# Altium footprint library THU.PcbLib: 477 footprints (part 1 of 30)
Each footprint in its own frame and in the unit in brackets; x right, y up, seen from the top. Pads: shape width x height; smd on the part's side, far side on the other; paste and mask are expansions set on the pad; w line width, h text height; cw(c..) or ccw(c..) is an arc to the next point about the centre after c.
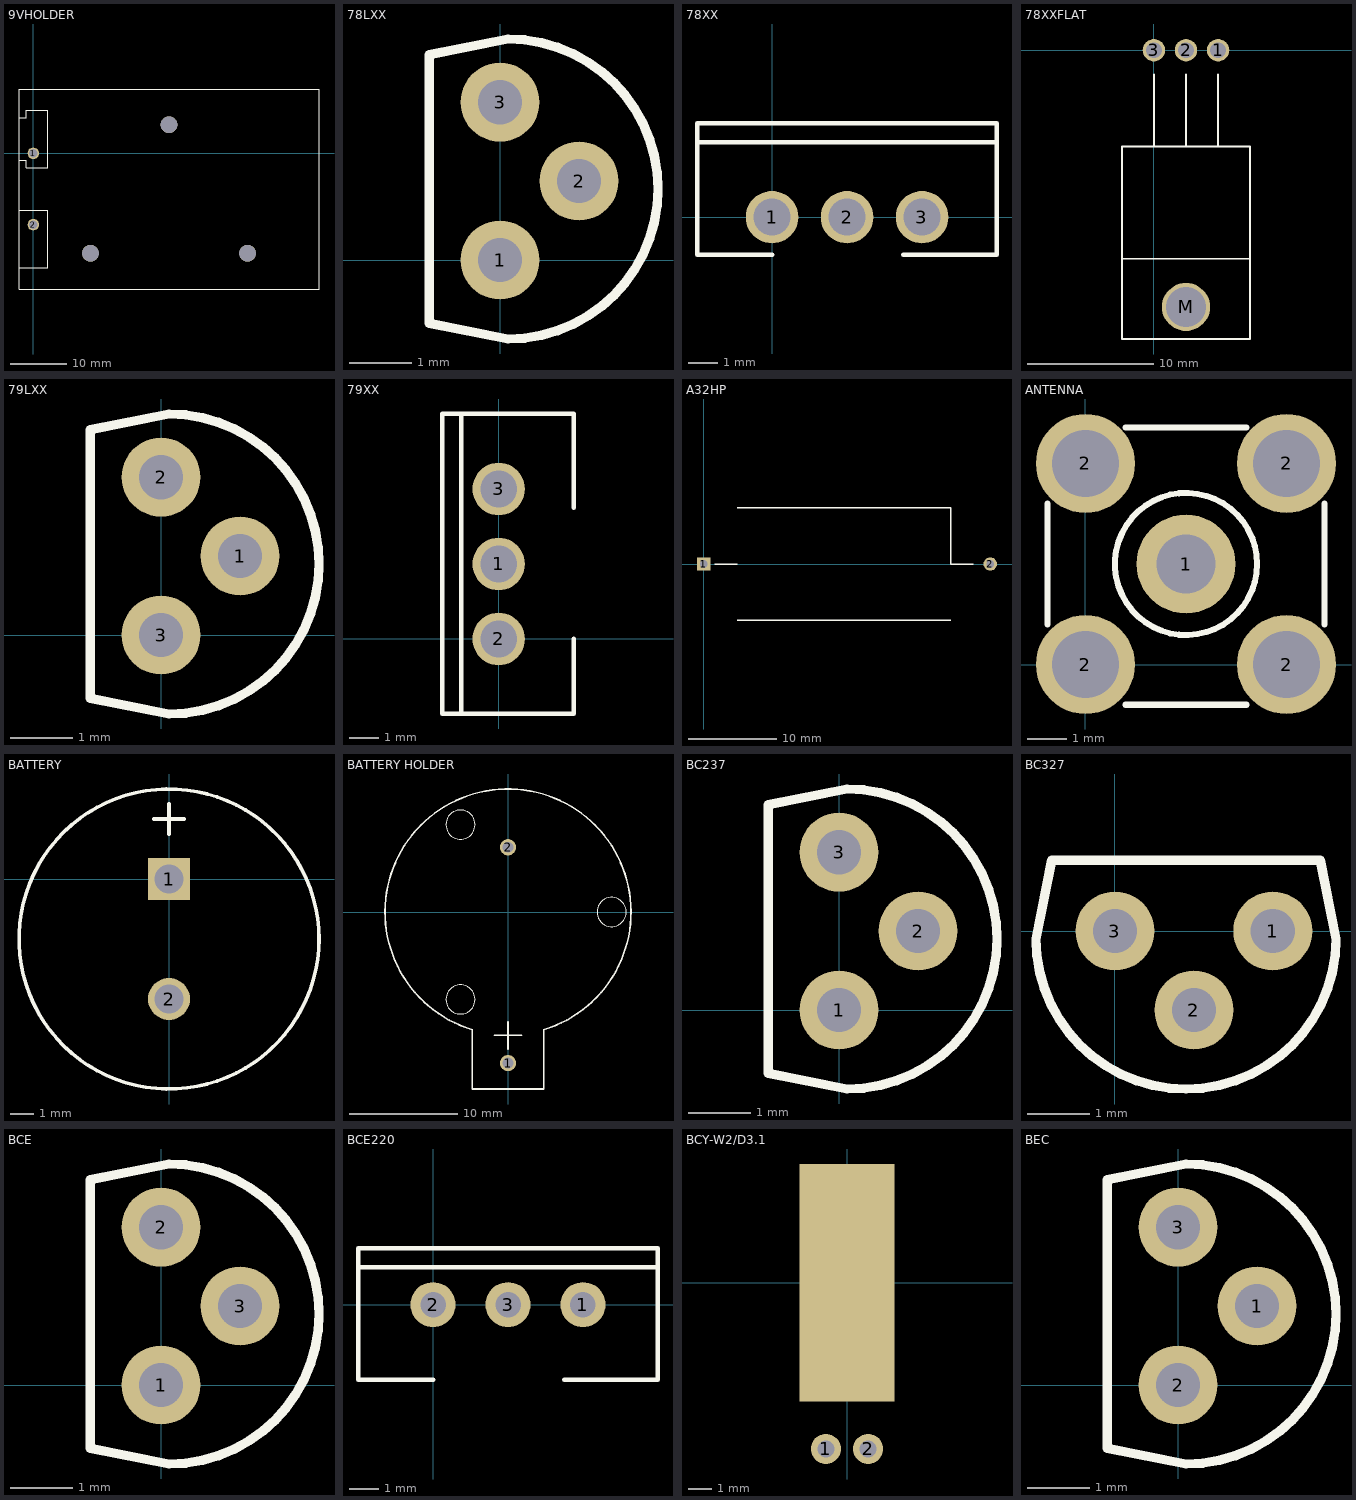
[diagram p0: the footprints below, top view; thin cyan lines are the x and y axes]

## 9VHOLDER [mm]
pads (5):
  round 2.032 hole 1.524: 1(0,0) 2(0,-12.7)
  round 3 hole 3 unplated: ""(10.16,-17.78) ""(24.13,5.08) ""(38.1,-17.78)
TopOverlay:
  lines w0.152: -2.54,-20.32 2.54,-20.32 2.54,-10.16 -2.54,-10.16 ; -2.54,-1.27 -1.27,-1.27 -1.27,-2.54 2.54,-2.54 2.54,7.62 -1.27,7.62 -1.27,6.35 -2.54,6.35 ; -2.54,-24.13 -2.54,11.43 50.8,11.43 50.8,-24.13 -2.54,-24.13

## 78LXX [mil]
pads (3):
  round 50 hole 28: 1(0,0) 2(50,50) 3(0,100)
TopOverlay:
  lines w6: -45,-40 5,-50 ccw(c5,45) 5,140 -45,130 -45,-40

## 78XX [mil]
pads (3):
  round 70 hole 49: 1(0,0) 2(100,0) 3(200,0)
TopOverlay:
  lines w6: -100,100 300,100 ; 0,-50 -100,-50 -100,75 -100,125 300,125 300,75 300,-50 175,-50

## 78XXFLAT [mil]
pads (4):
  round 70 hole 49: 1(200,0) 2(100,0) 3(0,0)
  round 150 hole 125: M(100,-800)
TopOverlay:
  lines w6: -100,-650 300,-650 ; 0,-300 0,-75 ; 100,-300 100,-75 ; 200,-300 200,-75 ; -100,-900 300,-900 300,-300 -100,-300 -100,-900

## 79LXX [mil]
pads (3):
  round 50 hole 28: 1(50,50) 2(0,100) 3(0,0)
TopOverlay:
  lines w6: -45,-40 -45,130 5,140 cw(c5,45) 5,-50 -45,-40

## 79XX [mil]
pads (3):
  round 70 hole 49: 1(0,100) 2(0,0) 3(0,200)
TopOverlay:
  lines w6: -50,150 -50,175 ; 100,0 100,-100 -50,-100 ; 100,175 100,300 -50,300 ; -50,-100 -75,-100 -75,300 -50,300 ; -50,-100 -50,300

## A32HP [mil]
pads (2):
  rect 60x60 hole 34: 1(0,0)
  round 60 hole 34: 2(1275,0)
TopOverlay:
  lines w6: 50,0 150,0 ; 150,-250 1100,-250 ; 150,250 1100,250 1100,0 1200,0

## ANTENNA [mm]
pads (5):
  round 2.5 hole 1.5: 1(2.54,2.54)
  round 2.5 hole 1.7: 2(0,0) 2(0,5.08) 2(5.08,0) 2(5.08,5.08)
TopOverlay:
  circle w0.152: c2.54,2.54 r1.796
  lines w0.152: -0.955,1.016 -0.955,4.064 ; 1.016,-1.016 4.064,-1.016 ; 1.016,5.984 4.064,5.984 ; 6.045,1.016 6.045,4.064

## BATTERY [mil]
pads (2):
  rect 70x70 hole 49: 1(0,0)
  round 70 hole 49: 2(0,-200)
TopOverlay:
  circle w6: c0,-100 r250
  lines w6: -25,100 25,100 ; 0,75 0,125

## BATTERY HOLDER [mm] "MULTICOMP CH25-2032LF"
height 8.8
pads (2):
  round 1.5 hole 1: 1(0,-14) 2(0,6)
TopOverlay:
  circle w0.003: c-4.4,8.1 r1.352
  circle w0.003: c-4.4,-8.1 r1.352
  circle w0.003: c9.6,0 r1.352
  lines w0.152: -3.3,-10.922 -3.3,-16.4 3.3,-16.4 3.3,-10.922 ; -3.297,-10.913 cw(c0,0) 3.297,-10.913 ; -1.27,-11.43 1.27,-11.43 ; 0,-12.7 0,-10.16

## BC237 [mil]
pads (3):
  round 50 hole 28: 1(0,0) 2(50,50) 3(0,100)
TopOverlay:
  lines w6: -45,-40 -45,130 5,140 cw(c5,45) 5,-50 -45,-40

## BC327 [mil]
pads (3):
  round 50 hole 28: 1(100,0) 2(50,-50) 3(0,0)
TopOverlay:
  lines w6: -50,-5 ccw(c45,-5) 140,-5 130,45 -40,45 -50,-5

## BCE [mil]
pads (3):
  round 50 hole 28: 1(0,0) 2(0,100) 3(50,50)
TopOverlay:
  lines w6: -45,-40 -45,130 5,140 cw(c5,45) 5,-50 -45,-40

## BCE220 [mil]
pads (3):
  round 60 hole 34: 1(200,0) 2(0,0) 3(100,0)
TopOverlay:
  lines w6: 0,-100 -100,-100 -100,50 ; 150,50 175,50 ; 175,-100 300,-100 300,50 ; -100,50 300,50 ; -100,50 -100,75 300,75 300,50

## BCY-W2/D3.1 [mil] "CYLINDER TYPE"
height 118.11
pads (3):
  round 50 hole 28: 1(-35,-275) 2(35,-275)
  rect 157.48x393.7 smd: ""(0,0)

## BEC [mil]
pads (3):
  round 50 hole 28: 1(50,50) 2(0,0) 3(0,100)
TopOverlay:
  lines w6: -45,-40 -45,130 5,140 cw(c5,45) 5,-50 -45,-40